# Altium footprint library 1.20-电感.PcbLib: 64 footprints (part 4 of 4)
Each footprint in its own frame and in the unit in brackets; x right, y up, seen from the top. Pads: shape width x height; smd on the part's side, far side on the other; paste and mask are expansions set on the pad; w line width, h text height; cw(c..) or ccw(c..) is an arc to the next point about the centre after c.
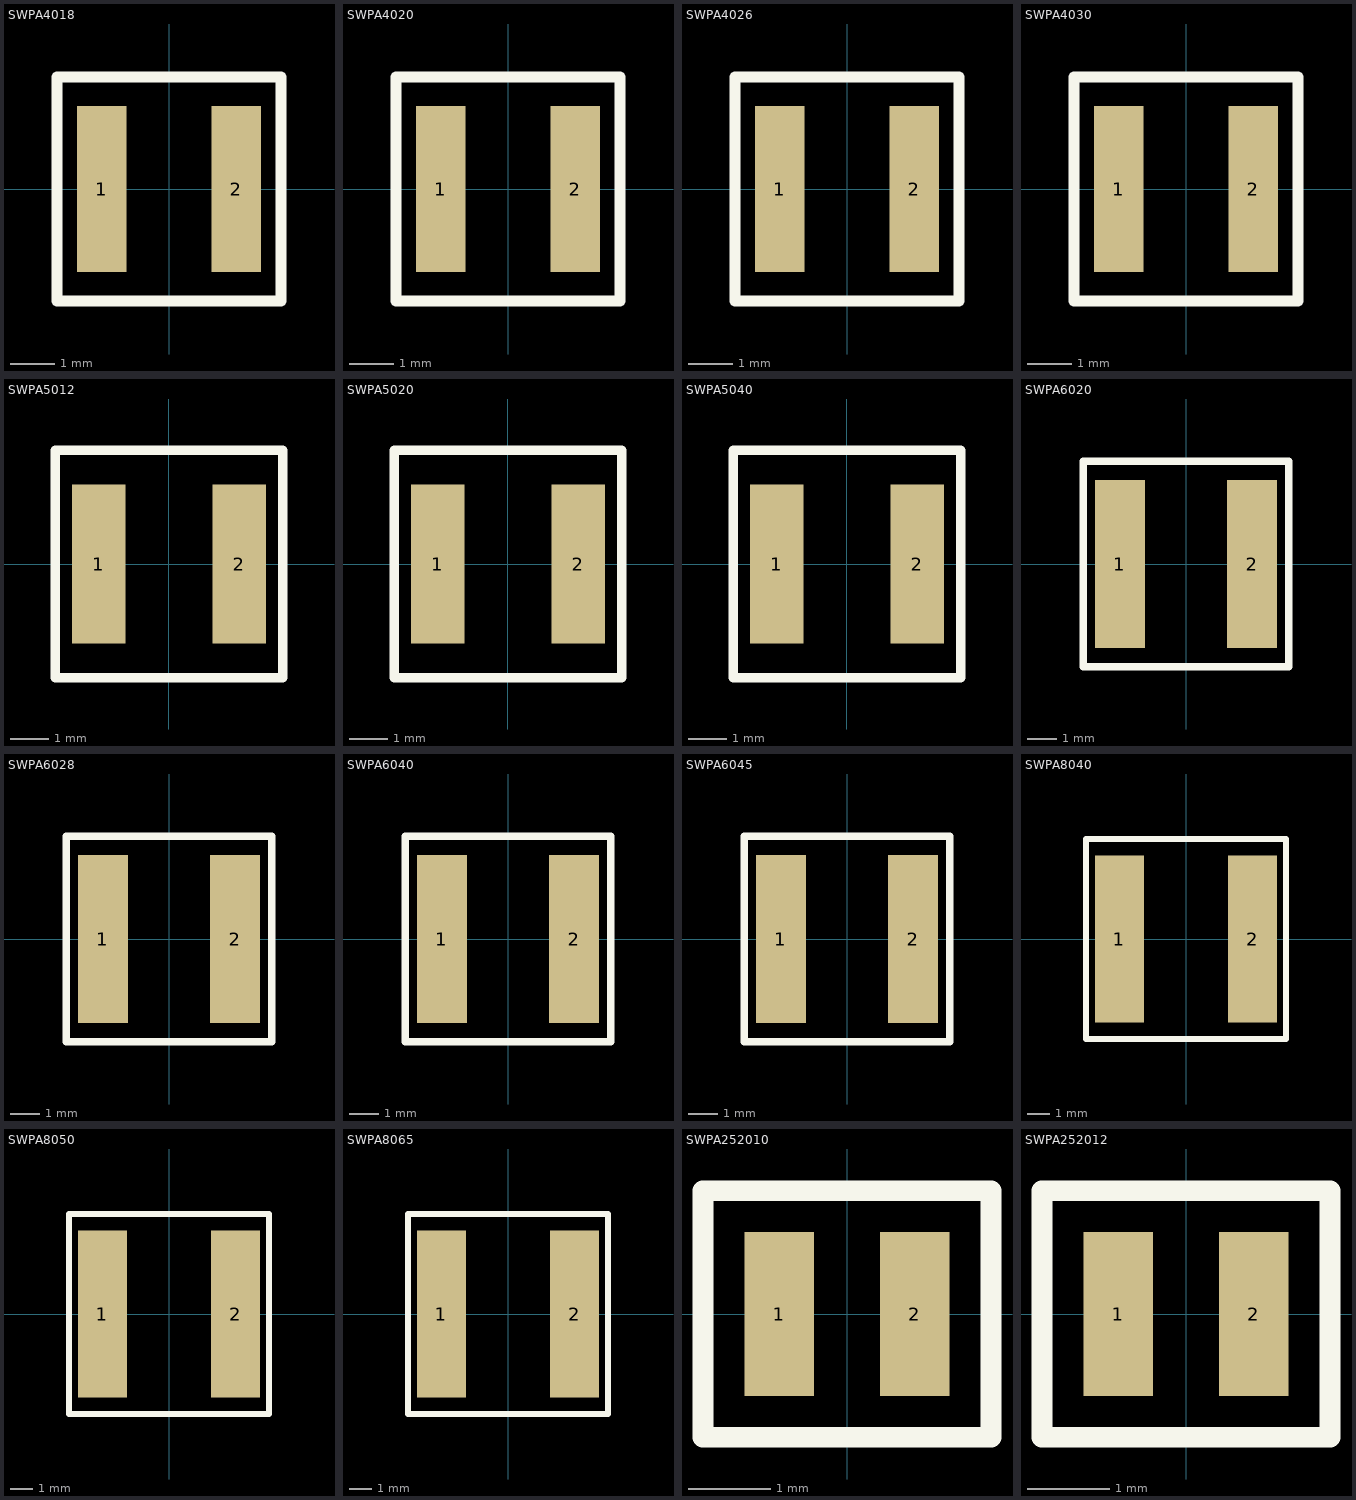
[diagram p3: the footprints below, top view; thin cyan lines are the x and y axes]

## SWPA4018 [mm] "轮廓4mm*4mm ，焊盘间距1.9mm      [ PCB学习群514746572 ]"
height 1.8
pads (2):
  rect 1.1x3.7 smd: 1(-1.5,0) 2(1.5,0)
Top Overlay:
  lines w0.254: -2.5,-2.5 -2.5,2.5 2.5,2.5 2.5,-2.5 -2.5,-2.5
3D body "4018.STEP": height 1.8, standoff -0.02, extent -2,-2 2,2

## SWPA4020 [mm] "轮廓4mm*4mm ，焊盘间距1.9mm      [ PCB学习群514746572 ]"
height 2
pads (2):
  rect 1.1x3.7 smd: 1(-1.5,0) 2(1.5,0)
Top Overlay:
  lines w0.254: -2.5,-2.5 -2.5,2.5 2.5,2.5 2.5,-2.5 -2.5,-2.5
3D body "4020.STEP": height 2, standoff -0.02, extent -2,-2 2,2

## SWPA4026 [mm] "轮廓4mm*4mm ，焊盘间距1.9mm      [ PCB学习群514746572 ]"
height 2.6
pads (2):
  rect 1.1x3.7 smd: 1(-1.5,0) 2(1.5,0)
Top Overlay:
  lines w0.254: -2.5,-2.5 2.5,-2.5 2.5,2.5 -2.5,2.5 -2.5,-2.5
3D body "4026.STEP": height 2.6, standoff -0.02, extent -2,-2 2,2

## SWPA4030 [mm] "轮廓4mm*4mm ，焊盘间距1.9mm      [ PCB学习群514746572 ]"
height 3
pads (2):
  rect 1.1x3.7 smd: 1(-1.5,0) 2(1.5,0)
Top Overlay:
  lines w0.254: -2.5,-2.5 -2.5,2.5 2.5,2.5 2.5,-2.5 -2.5,-2.5
3D body "4030.STEP": height 3, standoff -0.02, extent -2,-2 2,2

## SWPA5012 [mm] "轮廓5mm*5mm ，焊盘间距2.3mm      [ PCB学习群514746572 ]"
height 1.2
pads (2):
  rect 1.4x4.2 smd: 1(-1.85,0) 2(1.85,0)
Top Overlay:
  lines w0.254: -3,-3 3,-3 3,3 -3,3 -3,-3
3D body "5012S.STEP": height 1.2, standoff -0.02, extent -2.5,-2.5 2.5,2.5

## SWPA5020 [mm] "轮廓5mm*5mm ，焊盘间距2.3mm      [ PCB学习群514746572 ]"
height 2
pads (2):
  rect 1.4x4.2 smd: 1(-1.85,0) 2(1.85,0)
Top Overlay:
  lines w0.254: -3,-3 3,-3 3,3 -3,3 -3,-3
3D body "5020S.STEP": height 2, standoff -0.02, extent -2.5,-2.5 2.5,2.5

## SWPA5040 [mm] "轮廓5mm*5mm ，焊盘间距2.3mm      [ PCB学习群514746572 ]"
height 4
pads (2):
  rect 1.4x4.2 smd: 1(-1.85,0) 2(1.85,0)
Top Overlay:
  lines w0.254: -3,-3 -3,3 3,3 3,-3 -3,-3
3D body "5040S.STEP": height 4, standoff -0.02, extent -2.5,-2.5 2.5,2.5

## SWPA6020 [mm] "轮廓6mm*6mm ，焊盘间距2.8mm      [ PCB学习群514746572 ]"
height 2
pads (2):
  rect 1.7x5.7 smd: 1(-2.25,0) 2(2.25,0)
Top Overlay:
  lines w0.254: -3.5,-3.5 -3.5,3.5 0,3.5 3.5,3.5 3.5,-3.5 -3.5,-3.5
3D body "6020S.STEP": height 2, standoff -0.02, extent -3,-3 3,3

## SWPA6028 [mm] "轮廓6mm*6mm ，焊盘间距2.8mm      [ PCB学习群514746572 ]"
height 2.8
pads (2):
  rect 1.7x5.7 smd: 1(-2.25,0) 2(2.25,0)
Top Overlay:
  lines w0.254: -3.5,-3.5 3.5,-3.5 3.5,3.5 0,3.5 -3.5,3.5 -3.5,-3.5
3D body "6028S.STEP": height 2.5, standoff -0.02, extent -3,-3 3,3

## SWPA6040 [mm] "轮廓6mm*6mm ，焊盘间距2.8mm      [ PCB学习群514746572 ]"
height 4
pads (2):
  rect 1.7x5.7 smd: 1(-2.25,0) 2(2.25,0)
Top Overlay:
  lines w0.254: -3.5,-3.5 3.5,-3.5 3.5,3.5 0,3.5 -3.5,3.5 -3.5,-3.5
3D body "5040S.STEP": height 4, standoff -0.02, extent -2.5,-2.5 2.5,2.5

## SWPA6045 [mm] "轮廓6mm*6mm ，焊盘间距2.8mm      [ PCB学习群514746572 ]"
height 4.5
pads (2):
  rect 1.7x5.7 smd: 1(-2.25,0) 2(2.25,0)
Top Overlay:
  lines w0.254: -3.5,-3.5 -3.5,3.5 0,3.5 3.5,3.5 3.5,-3.5 -3.5,-3.5
3D body "6045S.STEP": height 4.5, standoff -0.02, extent -3,-3 3,3

## SWPA8040 [mm] "轮廓8mm*8mm ，焊盘间距3.8mm      [ PCB学习群514746572 ]"
height 4
pads (2):
  rect 2.2x7.5 smd: 1(-3,0) 2(3,0)
Top Overlay:
  lines w0.254: -4.5,-4.5 -4.5,4.5 0,4.5 4.5,4.5 4.5,-4.5 -4.5,-4.5
3D body "8040.STEP": height 4, standoff -0.02, extent -4,-4 4,4

## SWPA8050 [mm] "轮廓8mm*8mm ，焊盘间距3.8mm      [ PCB学习群514746572 ]"
height 5
pads (2):
  rect 2.2x7.5 smd: 1(-3,0) 2(3,0)
Top Overlay:
  lines w0.254: -4.5,-4.5 4.5,-4.5 4.5,4.5 0,4.5 -4.5,4.5 -4.5,-4.5
3D body "8050.STEP": height 5, standoff -0.02, extent -4,-4 4,4

## SWPA8065 [mm] "轮廓8mm*8mm ，焊盘间距3.8mm      [ PCB学习群514746572 ]"
height 6.5
pads (2):
  rect 2.2x7.5 smd: 1(-3,0) 2(3,0)
Top Overlay:
  lines w0.254: -4.5,-4.5 -4.5,4.5 0,4.5 4.5,4.5 4.5,-4.5 -4.5,-4.5
3D body "8065.STEP": height 6.5, standoff -0.02, extent -4,-4 4,4

## SWPA252010 [mm] "轮廓2.5mm*2mm ，焊盘间距0.8mm      [ PCB学习群514746572 ]"
height 1
pads (2):
  rect 0.85x2 smd: 1(-0.825,0) 2(0.825,0)
Top Overlay:
  lines w0.254: -1.75,-1.5 -1.75,1.5 0,1.5 1.75,1.5 1.75,-1.5 -1.75,-1.5
3D body "252010.STEP": height 1, standoff -0.02, extent -1.25,-1.25 1.25,1.25

## SWPA252012 [mm] "轮廓2.5mm*2mm ，焊盘间距0.8mm      [ PCB学习群514746572 ]"
height 1.2
pads (2):
  rect 0.85x2 smd: 1(-0.825,0) 2(0.825,0)
Top Overlay:
  lines w0.254: -1.75,-1.5 -1.75,1.5 0,1.5 1.75,1.5 1.75,-1.5 -1.75,-1.5
3D body "252012.stp": height 1.2, standoff -0.07, extent -1.25,-1.25 1.25,1.25